# Altium footprint library MyPcbLib.PcbLib: 657 footprints (part 30 of 42)
Each footprint in its own frame and in the unit in brackets; x right, y up, seen from the top. Pads: shape width x height; smd on the part's side, far side on the other; paste and mask are expansions set on the pad; w line width, h text height; cw(c..) or ccw(c..) is an arc to the next point about the centre after c.
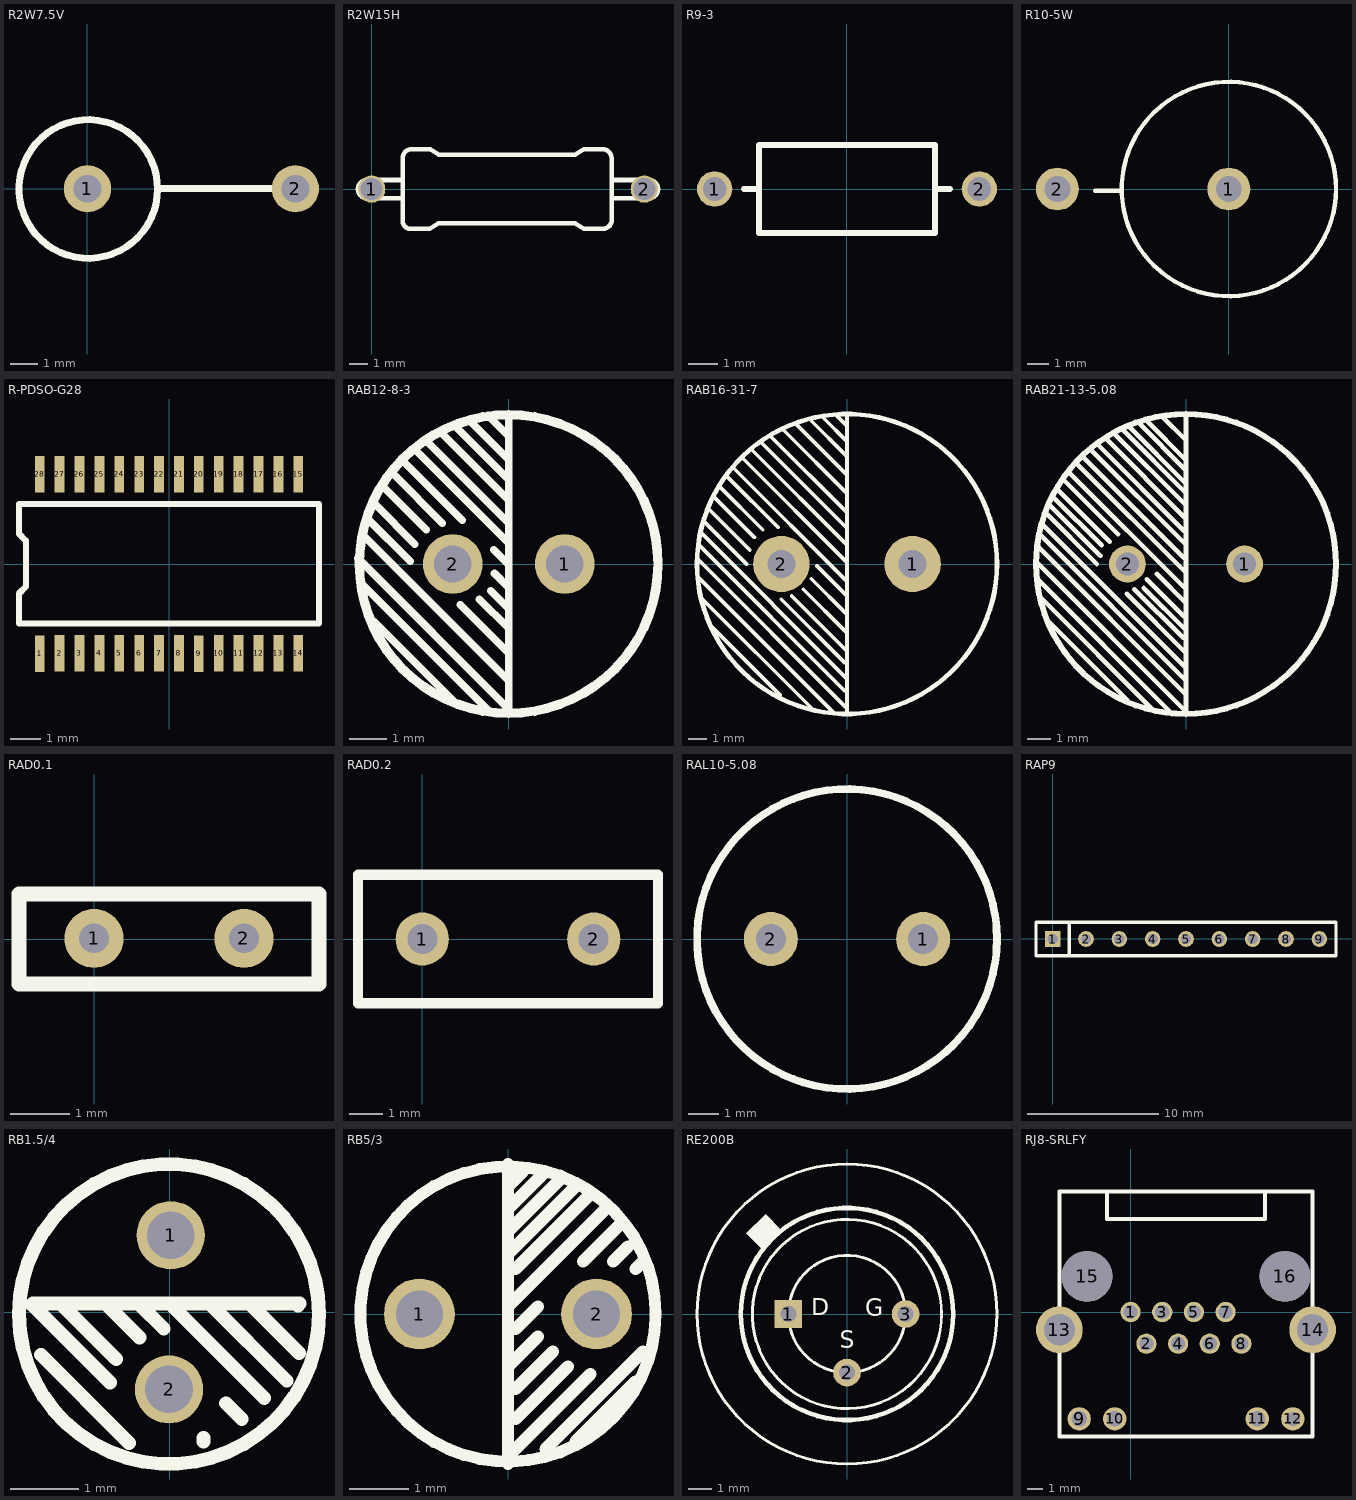
[diagram p29: the footprints below, top view; thin cyan lines are the x and y axes]

## R2W7.5V [mm]
pads (2):
  round 1.7 / inner round 1.7 / far side round 2.5 hole 1: 1(0,0) 2(7.5,0)
Top Overlay:
  circle w0.254: c0.03,-0.01 r2.5
  lines w0.254: 2.54,0 7.5,0

## R2W15H [mm]
pads (2):
  round 1.5 / inner round 1.5 / far side round 2.5 hole 1.2: 1(0,0) 2(15,0)
Top Overlay:
  lines w0.25: -0.25,-0.5 1.702,-0.5 ; -0.25,0.5 1.705,0.5 ; 13.202,-0.5 15.25,-0.5 ; 13.202,0.5 15.25,0.5 ; 1.702,-1.719 ccw(c2.157,-1.734) 2.172,-2.189 3.172,-2.189 3.672,-1.889 11.202,-1.889 11.702,-2.189 12.702,-2.189 ccw(c12.707,-1.695) 13.202,-1.689 13.202,1.701 ccw(c12.677,1.675) 12.702,2.201 11.702,2.201 11.202,1.901 3.702,1.901 3.202,2.201 2.202,2.201 ccw(c2.214,1.688) 1.702,1.701 1.702,-1.719
  lines w0.254: -0.25,-0.5 cw(c-0.25,0) -0.25,0.5 ; 15.25,-0.5 ccw(c15.25,0) 15.25,0.5

## R9-3 [mm]
pads (2):
  round 1.2 hole 0.8: 1(-4.5,0) 2(4.5,0)
Top Overlay:
  lines w0.203: -3.5,0 -3,0 ; 3,0 3.5,0 ; -3,-1.5 3,-1.5 3,1.5 -3,1.5 -3,-1.5

## R10-5W [mm]
pads (2):
  round 2 hole 1.2: 1(0,0) 2(-8,0)
Top Overlay:
  circle w0.203: c0,0 r5
  lines w0.203: -6.248,-0.076 -5.004,-0.076

## R-PDSO-G28 [mm]
pads (28):
  rect 0.32x1.2 smd: 1(-4.225,-2.936) 2(-3.575,-2.914) 3(-2.925,-2.914) 4(-2.275,-2.914) 5(-1.625,-2.914) 6(-0.975,-2.914) 7(-0.325,-2.914) 8(0.325,-2.914) 9(0.975,-2.936) 10(1.625,-2.914) 11(2.275,-2.914) 12(2.925,-2.914) 13(3.575,-2.914) 14(4.225,-2.914) 15(4.225,2.936) 16(3.575,2.936) 17(2.925,2.936) 18(2.275,2.936) 19(1.625,2.936) 20(0.975,2.936) 21(0.325,2.936) 22(-0.325,2.936) 23(-0.975,2.936) 24(-1.625,2.936) 25(-2.275,2.936) 26(-2.925,2.936) 27(-3.575,2.936) 28(-4.225,2.936)
Top Overlay:
  lines w0.203: -4.9,-1.939 4.9,-1.939 4.9,1.961 -4.9,1.961 -4.9,0.986 -4.674,0.759 -4.674,-0.738 -4.9,-0.964 -4.9,-1.939

## RAB12-8-3 [mm]
pads (2):
  round 1.6 hole 1: 1(1.5,0) 2(-1.5,0)
Top Overlay:
  circle w0.254: c0,0 r4
  lines w0.203: -4.039,0.152 0,-3.886 ; -3.962,-0.508 -0.559,-3.912 ; -3.886,0.762 -2.489,-0.635 0,-3.124 ; -3.785,1.219 -2.642,0.076 ; -3.607,-1.549 -1.372,-3.785 ; -3.581,1.6 -2.515,0.533 ; -3.353,2.057 -2.21,0.914 ; -3.073,2.388 -1.778,1.092 ; -2.845,2.769 -1.245,1.168 ; -2.54,3.099 0,0.559 ; -2.184,3.277 0,1.092 ; -1.854,3.556 0,1.702 ; -1.448,3.708 0,2.261 ; -1.295,-1.092 0,-2.388 ; -0.991,3.785 0,2.794 ; -0.787,-0.94 0,-1.727 ; -0.559,3.988 0,3.429 ; -0.483,-0.711 0,-1.194 ; -0.406,0.381 0,-0.025 ; -0.381,-0.254 -0.025,-0.61 ; 0,-3.988 0,3.962
3D body: height 12.3, standoff -1.5, extent -3.924,-4.064 4.076,3.936

## RAB16-31-7 [mm]
pads (2):
  round 3 hole 1.5: 1(3.5,0) 2(-3.5,0)
Top Overlay:
  circle w0.254: c0,0 r8
  lines w0.203: -7.976,-0.66 -0.686,-7.95 ; -7.976,0.279 -0.102,-7.595 ; -7.925,1.041 -0.127,-6.756 ; -7.849,1.727 -0.076,-6.045 ; -7.823,-1.753 -1.854,-7.722 ; -7.62,2.261 -5.359,0 ; -7.417,2.972 -5.182,0.737 ; -7.315,-3.251 -3.581,-6.985 ; -7.087,3.581 -4.928,1.422 ; -6.807,4.14 -4.496,1.829 ; -6.401,4.674 -3.683,1.956 ; -6.071,5.131 0,-0.94 ; -5.563,5.639 -0.051,0.127 ; -5.08,6.096 0,1.016 ; -4.572,6.477 -0.051,1.956 ; -4.064,6.807 0,2.743 ; -3.505,-1.88 -0.127,-5.258 ; -3.404,7.163 0,3.759 ; -2.946,-1.702 -0.076,-4.572 ; -2.718,7.468 -0.076,4.826 ; -2.337,-1.346 -0.076,-3.607 ; -1.93,7.671 -0.076,5.817 ; -1.905,-0.787 -0.025,-2.667 ; -1.6,-0.102 0,-1.702 ; -1.27,7.798 0,6.528 ; -0.559,7.925 0,7.366 ; 0,-8 0,8
3D body: height 31.75, standoff -1.75, extent -7.975,-8.026 8.025,7.974

## RAB21-13-5.08 [mm]
pads (2):
  round 1.6 hole 1: 1(2.54,0) 2(-2.54,0)
Top Overlay:
  circle w0.254: c0,0 r6.5
  lines w0.203: -6.477,-0.61 -0.587,-6.5 ; -6.477,0.813 0,-5.664 ; -6.452,0.051 0,-6.401 ; -6.325,1.27 0,-5.055 ; -6.274,-1.473 -1.397,-6.35 ; -6.223,1.727 -0.051,-4.445 ; -6.096,2.235 -3.861,0 ; -5.944,2.591 -3.708,0.356 ; -5.893,-2.54 -2.54,-5.893 ; -5.766,2.921 -3.658,0.813 ; -5.563,3.226 -3.302,0.965 ; -5.334,3.683 -2.946,1.295 ; -5.055,3.962 0,-1.092 ; -4.75,4.369 0,-0.381 ; -4.445,4.623 -0.102,0.279 ; -4.14,4.978 0,0.838 ; -3.835,5.182 -0.076,1.422 ; -3.505,5.461 -0.025,1.981 ; -3.175,5.715 0,2.54 ; -2.743,5.817 0,3.073 ; -2.565,-1.295 0,-3.861 ; -2.489,5.969 0,3.48 ; -2.235,-1.092 -0.127,-3.2 ; -2.007,6.071 -0.051,4.115 ; -1.829,-1.041 0,-2.87 ; -1.702,-0.66 -0.076,-2.286 ; -1.702,6.198 0,4.496 ; -1.27,-0.432 0,-1.702 ; -1.041,6.401 0,5.359 ; 0,-6.5 0,6.5
3D body: height 1, standoff -22, extent -6.769,-6.75 6.731,6.75

## RAD0.1 [mm]
pads (2):
  round 1 hole 0.5: 1(-0.004,0.009) 2(2.536,0.009)
Top Overlay:
  lines w0.254: -1.274,-0.762 -1.274,0.762 3.806,0.762 3.806,-0.762 -1.274,-0.762
3D body: height 5.42, standoff -1.58, extent -1.147,-0.508 3.687,0.492

## RAD0.2 [mil]
pads (2):
  round 62 hole 35: 1(0,0) 2(200,0)
Top Overlay:
  lines w12: -75,-75 275,-75 275,75 -75,75 -75,-75

## RAL10-5.08 [mm]
pads (2):
  round 1.8 hole 1: 1(2.54,0) 2(-2.54,0)
Top Overlay:
  circle w0.254: c0,0 r5
3D body: height 14, standoff -2, extent -5.08,-5.08 4.92,4.92

## RAP9 [mil]
pads (9):
  rect 47x47 hole 31.5: 1(-0.36,-0.43)
  round 47 hole 31.5: 2(99.64,-0.43) 3(199.64,-0.43) 4(299.64,-0.43) 5(399.64,-0.43) 6(499.64,-0.43) 7(599.64,-0.43) 8(699.64,-0.43) 9(799.64,-0.43)
Top Overlay:
  lines w10: 49.64,-50.43 49.64,49.57 ; -50.36,-50.43 -50.36,49.57 849.64,49.57 849.64,-50.43 -50.36,-50.43
3D body: height 167.48, standoff -52.99, extent -33.07,-38.74 833.07,40

## RB1.5/4 [mm]
pads (2):
  round 1 hole 0.7: 1(0.013,1.13) 2(-0.013,-1.13)
Top Overlay:
  circle w0.203: c-0.013,-0.025 r2.2
  lines w0.203: -2.007,0.102 -0.876,-1.029 ; -2.007,0.127 1.88,0.127 ; -1.892,-0.622 -0.597,-1.918 ; -1.587,0.114 -0.787,-0.686 ; -0.927,0.114 -0.445,-0.368 ; -0.445,0.114 -0.089,-0.241 ; 0.013,0.114 1.384,-1.257 ; 0.495,-1.892 0.495,-1.841 ; 0.597,0.114 1.714,-1.003 ; 0.826,-1.333 1.054,-1.562 ; 1.181,0.114 1.892,-0.597 ; 1.88,0.102 1.905,0.127

## RB5/3 [mm]
pads (2):
  round 1.2 hole 0.8: 1(-1.5,0) 2(1.5,0)
Top Overlay:
  circle w0.203: c0,0 r2.5
  lines w0.203: 0,-2.54 0,2.54 ; 0,-2.413 1.397,-1.016 ; 0,-0.889 0.508,-0.381 ; 0,0.127 1.651,1.778 ; 0,1.016 1.143,2.159 ; 0,1.397 0.889,2.286 ; 0,1.778 0.635,2.413 ; 0,2.159 0.254,2.413 ; 0.127,-1.778 1.016,-0.889 ; 0.127,-1.27 0.762,-0.635 ; 0.127,-0.254 0.508,0.127 ; 0.127,0.762 1.397,2.032 ; 0.635,-2.286 2.286,-0.635 ; 1.143,-2.159 2.159,-1.143 ; 1.27,0.889 1.905,1.524 ; 1.778,0.889 2.032,1.143 ; 2.159,0.762 2.286,0.889
3D body: height 10.25, standoff -1.75, extent -2.475,-2.638 2.525,2.362

## RE200B [mm]
pads (3):
  rect 1.2x1.2 hole 0.7: 1(-2.54,0)
  round 1.2 hole 0.7: 2(0,-2.54) 3(2.54,0)
Top Overlay:
  circle w0.127: c0,0 r6.5
  circle w0.127: c0,0 r4.1
  circle w0.127: c0,0 r2.54
  circle w0.203: c0,0 r4.6
  region: -3.692,2.817 -2.848,3.661 -3.531,4.343 -4.375,3.499
  text "G" at 0.787,-0.33 h1.27
  text "D" at -1.549,-0.305 h1.27
  text "S" at -0.305,-1.727 h1.27

## RJ8-SRLFY [mm]
pads (16):
  round 1.3 hole 0.9: 1(-0.012,0.009) 2(1.004,-2.023) 3(2.02,0.009) 4(3.036,-2.023) 5(4.052,0.009) 6(5.068,-2.023) 7(6.084,0.009) 8(7.1,-2.023)
  round 1.5 hole 1: 9(-3.314,-6.849) 10(-1.028,-6.849) 11(8.116,-6.849)
  round 1.5 hole 0.9: 12(10.402,-6.849)
  round 3 hole 2: 13(-4.584,-1.134) 14(11.672,-1.134)
  round 3.251 hole 3.251: 15(-2.806,2.295) 16(9.894,2.295)
Top Overlay:
  lines w0.254: -1.536,7.756 -1.536,5.978 8.624,5.978 8.624,7.756 ; -4.584,-7.992 -4.584,-1.134 -4.584,7.756 11.672,7.756 11.672,-1.134 11.672,-7.992 -4.584,-7.992